# Altium footprint library SoM_Artix.PcbLib: 239 footprints (part 2 of 15)
Each footprint in its own frame and in the unit in brackets; x right, y up, seen from the top. Pads: shape width x height; smd on the part's side, far side on the other; paste and mask are expansions set on the pad; w line width, h text height; cw(c..) or ccw(c..) is an arc to the next point about the centre after c.
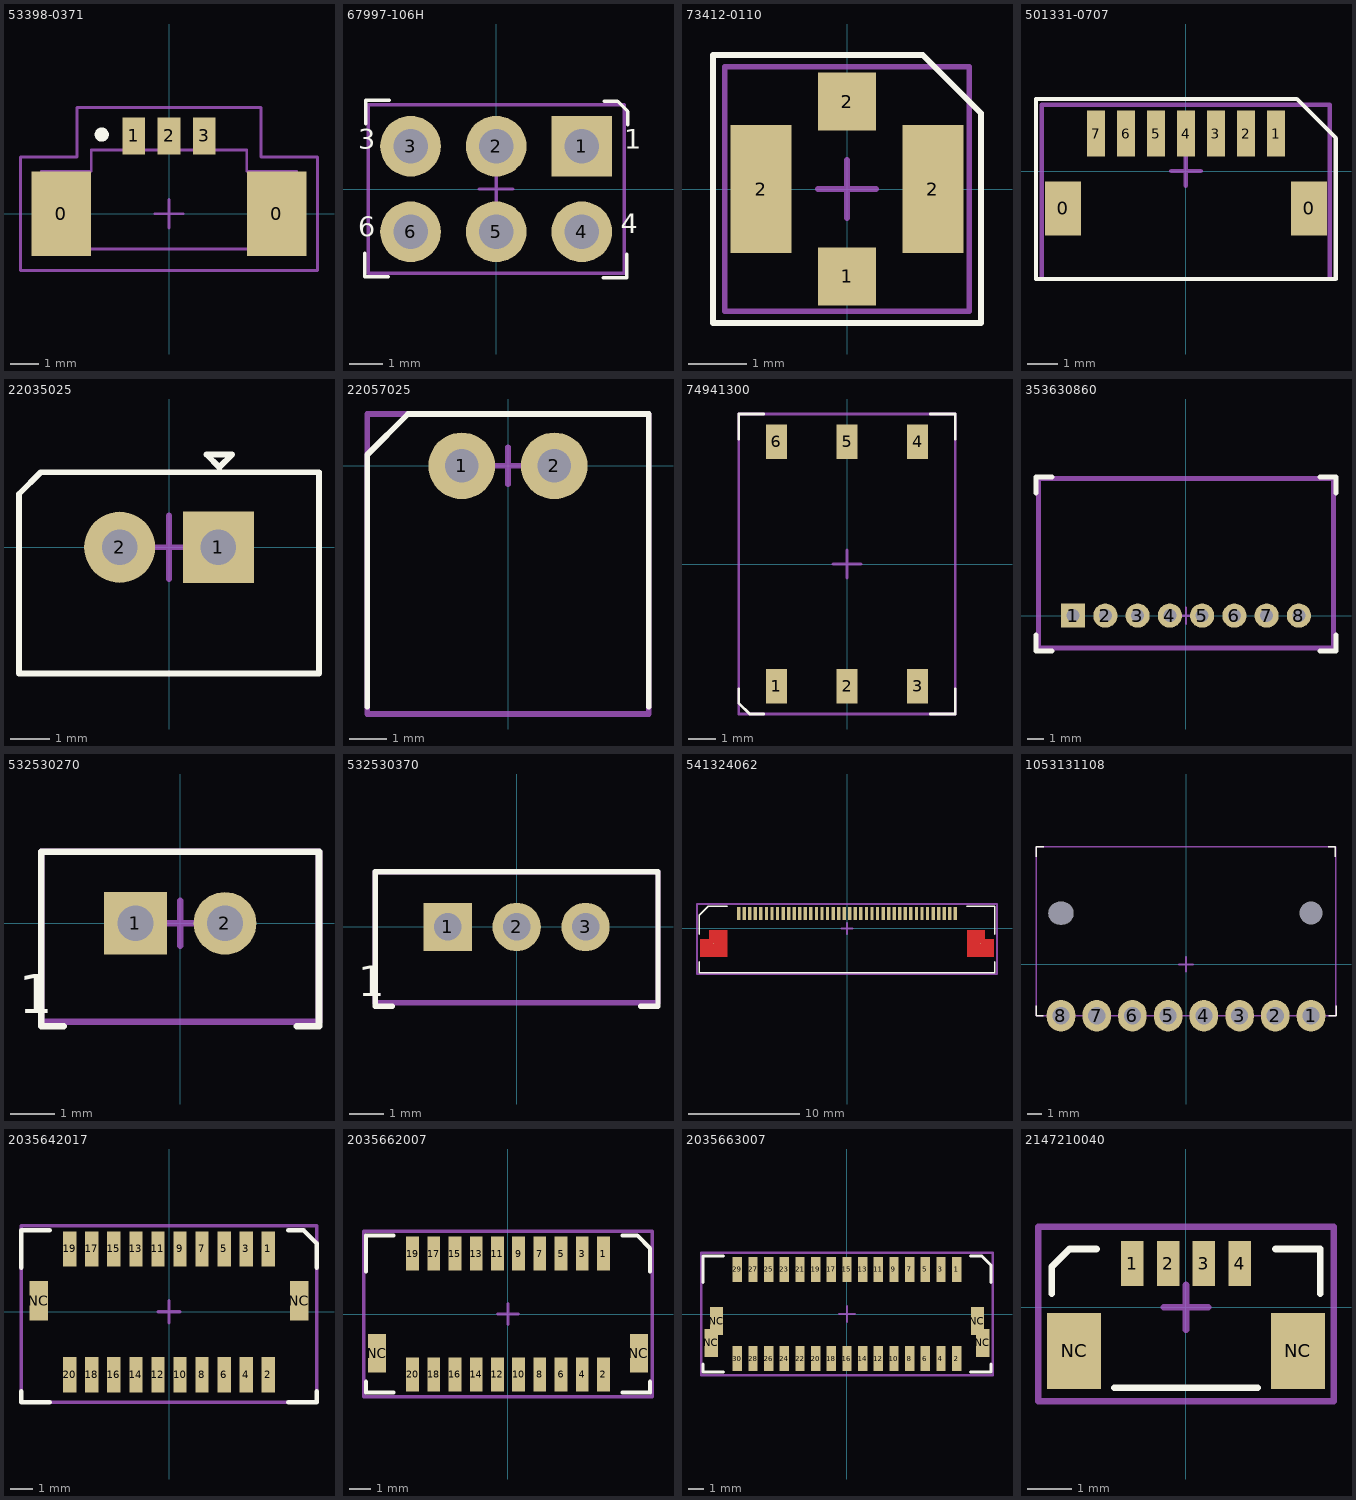
[diagram p1: the footprints below, top view; thin cyan lines are the x and y axes]

## 53398-0371 [mm] "PicoBlade™ 53398-0371"
height 4.7
pads (5):
  rect 2.1x3 smd: 0(-3.8,0) 0(3.8,0)
  rect 0.8x1.3 smd: 1(-1.25,2.75) 2(0,2.75) 3(1.25,2.75)
Top Overlay:
  circle w0.25: c-2.375,2.798 r0.125
Mechanical 1:
  lines w0.1: -4.5,-1.25 4.5,-1.25 4.5,1.5 2.75,1.5 2.75,2.25 -2.75,2.25 -2.75,1.5 -4.5,1.5 -4.5,-1.25
Mechanical 13:
  lines w0.1: -3.5,-0.75 -3.5,1 -4,0.5 ; -1.5,2.25 -1.5,3.25 -1,3.25 -1,2.25 ; -0.5,0 0.5,0 ; -0.25,2.25 -0.25,3.25 0.25,3.25 0.25,2.25 ; 0,-0.5 0,0.5 ; 1,2.25 1,3.25 1.5,3.25 1.5,2.25 ; -4,0.5 -4,0.5 ; -5.25,-2 5.25,-2 5.25,2 3.25,2 3.25,3.75 -3,3.75 -3.25,3.75 -3.25,2 -5.25,2 -5.25,-2 ; -4.5,-1.25 4.5,-1.25 4.5,1.5 2.75,1.5 2.75,2.25 -2.75,2.25 -2.75,1.5 -4.5,1.5 -4.5,-1.25
3D body "533980371.stp": height 4.7, standoff 0, extent -4.45,-1.35 4.45,2.85

## 67997-106H [mm]
pads (6):
  rect 1.8x1.8 hole 1.02 unplated mask+0.05: 1(2.54,1.27)
  round 1.8 hole 1.02 unplated mask+0.05: 2(0,1.27) 3(-2.54,1.27) 4(2.54,-1.27) 5(0,-1.27) 6(-2.54,-1.27)
Top Overlay:
  lines w0.1: -3.9,-1.9 -3.9,-2.6 -3.2,-2.6 ; -3.87,1.93 -3.87,2.63 -3.17,2.63 ; 3.17,-2.63 3.87,-2.63 3.87,-1.93 ; 3.2,2.6 3.6,2.6 3.9,2.3 3.9,1.9
  text "4" at 3.701,-1.5 h1
  text "6" at -4.1,-1.6 h1
  text "3" at -4.1,1 h1
  text "1" at 3.8,1 h1
Mechanical 15:
  lines w0.1: -0.5,0 0.5,0 ; 0,-0.5 0,0.5 ; -3.8,-2.5 -3.8,2.5 3.8,2.5 3.8,-2.5 -3.8,-2.5
3D body "User Library-PLD-6-2.STEP": height 7.83, standoff -2.97, extent -3.813,-2.517 3.807,2.483

## 73412-0110 [mm] "Connector pigtail"
pads (4):
  rect 1x1 smd: 1(0,-1.5) 2(0,1.5)
  rect 1.05x2.2 smd: 2(-1.475,0) 2(1.475,0)
Top Overlay:
  lines w0.1: -2.3,-2.3 -2.3,2.3 1.3,2.3 2.3,1.3 2.3,-2.3 -2.3,-2.3
Mechanical 13:
  lines w0.1: -0.5,0 0.5,0 ; 0,-0.5 0,0.5 ; -2.1,-2.1 2.1,-2.1 2.1,2.1 -2.1,2.1 -2.1,-2.1
3D body "734120110.stp": height 1.25, standoff 0, extent -1.5,-1.54 1.5,1.54

## 501331-0707 [mm] "Headers & Wire Housings 1.0 WtB 7Ckt StrWaferAssyEmbsTpPk"
height 5
pads (9):
  rect 1.2x1.8 smd: 0(-4.1,-1.25) 0(4.1,-1.25)
  rect 0.6x1.55 smd: 1(3,1.25) 2(2,1.25) 3(1,1.25) 4(0,1.25) 5(-1,1.25) 6(-2,1.25) 7(-3,1.25)
Top Overlay:
  lines w0.15: -5,-3.6 5,-3.6 5,1.1 3.7,2.4 -5,2.4 -5,-3.6
Mechanical 13:
  lines w0.15: -0.5,0 0.5,0 ; 0,-0.5 0,0.5 ; -4.8,-3.6 -4.8,2.2 4.8,2.2 4.8,-3.6 -4.8,-3.6
3D body "5013310707.stp": height 5.55, standoff 0, extent -4.62,-3.64 4.62,1.71

## 22035025 [mm] "2.50mm Pitch, Mini-SPOX PCB Header"
height 5.9
pads (2):
  rect 1.8x1.8 hole 0.9 mask+0.05: 1(1.25,0)
  round 1.8 hole 0.9 mask+0.05: 2(-1.25,0)
Top Overlay:
  lines w0.15: -3.8,-3.2 3.8,-3.2 3.8,1.9 -3.25,1.9 -3.8,1.35 -3.8,-3.2 ; 0.95,2.35 1.275,2.025 1.6,2.35 0.95,2.35
Mechanical 3:
  lines w0.15: -1.25,0 1.25,0 ; 0,-0.8 0,0.8
3D body "022035025.stp": height 5.95, standoff -3.45, extent -3.7,-3.12 3.7,1.78

## 22057025 [mm]
height 4.9
pads (2):
  round 1.8 hole 0.9: 1(-1.25,0) 2(1.25,0)
Top Overlay:
  lines w0.15: -3.8,-6.5 -3.8,0.3 -2.7,1.4 3.8,1.4 3.8,-6.5
Mechanical 15:
  lines w0.15: -0.5,0 0.5,0 ; 0,-0.5 0,0.5 ; -3.8,-6.7 -3.8,1.4 3.8,1.4 3.8,-6.7 -3.8,-6.7
3D body "022057025.stp": height 4.8, standoff -3.6, extent -3.7,-6.6 3.7,1.3

## 74941300 [mm]
pads (6):
  rect 0.76x1.25 smd mask+0.05: 1(-2.54,-4.4) 2(0,-4.4) 3(2.54,-4.4) 4(2.54,4.4) 5(0,4.4) 6(-2.54,4.4)
Top Overlay:
  lines w0.1: -3.9,-4.5 -3.9,-5 -3.5,-5.4 -3,-5.4 ; -3.9,4.5 -3.9,5.4 -3,5.4 ; 3,-5.4 3.9,-5.4 3.9,-4.5 ; 3,5.4 3.9,5.4 3.9,4.5
Mechanical 15:
  lines w0.1: -0.5,0 0.5,0 ; 0,-0.5 0,0.5 ; -3.9,-5.4 3.9,-5.4 3.9,5.4 -3.9,5.4 -3.9,-5.4
3D body "STP_WE-BMS_74941300 (rev1).stp": height 5.41, standoff 0, extent -3.8,-4.725 3.8,4.725

## 353630860 [mm]
pads (8):
  rect 1.5x1.5 hole 0.8: 1(-7,0)
  round 1.5 hole 0.8: 2(-5,0) 3(-3,0) 4(-1,0) 5(1,0) 6(3,0) 7(5,0) 8(7,0)
Top Overlay:
  lines w0.3: -9.3,-1.2 -9.3,-2.2 -8.3,-2.2 ; -9.3,7.6 -9.3,8.6 -8.3,8.6 ; 8.3,-2.2 9.3,-2.2 9.3,-1.2 ; 8.3,8.6 9.3,8.6 9.3,7.6
Mechanical 13:
  lines w0.15: -0.5,0 0.5,0 ; 0,-0.5 0,0.5
  lines w0.3: -9.15,-2 9.15,-2 9.15,8.5 -9.15,8.5 -9.15,-2
3D body "353630860.stp": height 5.55, standoff -3.15, extent -9.15,-1.95 9.15,8.55

## 532530270 [mm]
pads (2):
  rect 1.4x1.4 hole 0.8 mask+0.07: 1(-1,0)
  round 1.4 hole 0.8 mask+0.07: 2(1,0)
Top Overlay:
  lines w0.15: -2.6,-2.3 -3.1,-2.3 -3.1,1.6 3.1,1.6 3.1,-2.3 2.6,-2.3
  text "1" at -3.6,-2.3 h1.5
Mechanical 15:
  lines w0.15: -0.5,0 0.5,0 ; 0,-0.5 0,0.5 ; -3.1,-2.2 -3.1,1.6 3.1,1.6 3.1,-2.2 -3.1,-2.2
3D body "532530270.stp": height 5.7, standoff -3.3, extent -3,-2.15 3,1.5

## 532530370 [mm]
pads (3):
  rect 1.4x1.4 hole 0.8 mask+0.07: 1(-2,0)
  round 1.4 hole 0.8 mask+0.07: 2(0,0) 3(2,0)
Top Overlay:
  lines w0.15: -3.6,-2.3 -4.1,-2.3 -4.1,1.6 4.1,1.6 4.1,-2.3 3.6,-2.3
  text "1" at -4.6,-2.3 h1.5
Mechanical 15:
  lines w0.15: -0.5,0 0.5,0 ; 0,-0.5 0,0.5 ; -4.1,-2.2 -4.1,1.6 4.1,1.6 4.1,-2.2 -4.1,-2.2
3D body "532530370.stp": height 5.7, standoff -3.3, extent -4,-2.2 4,1.45

## 541324062 [mm]
pads (42):
  round 0.025 smd paste-0.001: 0(-12,-1.35) 0(12,-1.35)
  rect 0.3x1.2 smd mask+0.05: 1(-9.75,1.35) 2(-9.25,1.35) 3(-8.75,1.35) 4(-8.25,1.35) 5(-7.75,1.35) 6(-7.25,1.35) 7(-6.75,1.35) 8(-6.25,1.35) 9(-5.75,1.35) 10(-5.25,1.35) 11(-4.75,1.35) 12(-4.25,1.35) 13(-3.75,1.35) 14(-3.25,1.35) 15(-2.75,1.35) 16(-2.25,1.35) 17(-1.75,1.35) 18(-1.25,1.35) 19(-0.75,1.35) 20(-0.25,1.35) 21(0.25,1.35) 22(0.75,1.35) 23(1.25,1.35) 24(1.75,1.35) 25(2.25,1.35) 26(2.75,1.35) 27(3.25,1.35) 28(3.75,1.35) 29(4.25,1.35) 30(4.75,1.35) 31(5.25,1.35) 32(5.75,1.35) 33(6.25,1.35) 34(6.75,1.35) 35(7.25,1.35) 36(7.75,1.35) 37(8.25,1.35) 38(8.75,1.35) 39(9.25,1.35) 40(9.75,1.35)
Top Layer:
  region: 13.2,-2.55 13.2,-0.95 12.4,-0.95 12.4,-0.15 10.8,-0.15 10.8,-2.55
  region: -13.2,-2.55 -13.2,-0.95 -12.4,-0.95 -12.4,-0.15 -10.8,-0.15 -10.8,-2.55
Top Overlay:
  lines w0.15: -13.3,-3 -13.3,-4 13.3,-4 13.3,-3 ; -13.3,-0.5 -13.3,1.2 -12.5,2 -10.8,2 ; 10.8,2 13.3,2 13.3,-0.5
Mechanical 15:
  lines w0.15: -0.5,0 0.5,0 ; 0,-0.5 0,0.5 ; -13.5,-4.1 13.5,-4.1 13.5,2.2 -13.5,2.2 -13.5,-4.1
3D body "541324062.stp": height 2.05, standoff 0, extent -12.75,-4 12.75,1.6

## 1053131108 [mm]
pads (10):
  oval 2x2.2 hole 1.2 mask+0.05: 1(8.75,-3.59) 2(6.25,-3.59) 3(3.75,-3.59) 4(1.25,-3.59) 5(-1.25,-3.59) 6(-3.75,-3.59) 7(-6.25,-3.59) 8(-8.75,-3.59)
  round 0 hole 1.6 slot 1.75 at 0 deg unplated mask+0.05: NC(-8.75,3.59)
  round 0 hole 1.6 unplated mask+0.05: NC1(8.75,3.59)
Top Overlay:
  lines w0.1: -10.5,-2.9 -10.5,-3.6 -10,-3.6 ; -10.469,7.544 -10.469,8.244 -9.969,8.244 ; 9.965,8.248 10.465,8.248 10.465,7.548 ; 10,-3.6 10.5,-3.6 10.5,-2.9
Mechanical 15:
  lines w0.1: -10.47,-3.59 -10.47,8.25 10.47,8.25 10.47,-3.59 -10.47,-3.59
  lines w0.15: -0.5,0 0.5,0 ; 0,-0.5 0,0.5

## 2035642017 [mm] "1.00mm Pitch, Pico-Clasp PCB Header, Dual Row, Right-Angle, Surface Mount, 0.38µm Gold Plated, Inner Positive Lock, 20 Circuits, Natural"
pads (22):
  rect 0.6x1.6 smd: 1(4.5,2.85) 2(4.5,-2.85) 3(3.5,2.85) 4(3.5,-2.85) 5(2.5,2.85) 6(2.5,-2.85) 7(1.5,2.85) 8(1.5,-2.85) 9(0.5,2.85) 10(0.5,-2.85) 11(-0.5,2.85) 12(-0.5,-2.85) 13(-1.5,2.85) 14(-1.5,-2.85) 15(-2.5,2.85) 16(-2.5,-2.85) 17(-3.5,2.85) 18(-3.5,-2.85) 19(-4.5,2.85) 20(-4.5,-2.85)
  rect 0.85x1.8 smd: NC(-5.9,0.5) NC(5.9,0.5)
Top Overlay:
  lines w0.2: -6.7,-3.6 -6.7,-4.1 -5.4,-4.1 ; -6.7,2 -6.7,3.7 -5.4,3.7 ; 5.4,-4.1 6.7,-4.1 6.7,-3.6 ; 5.4,3.7 6.1,3.7 6.7,3.1 6.7,2
Mechanical 15:
  lines w0.15: -0.5,0 0.5,0 ; 0,-0.5 0,0.5 ; -6.7,-4.1 6.7,-4.1 6.7,3.9 -6.7,3.9 -6.7,-4.1
3D body "2035642017.stp": height 5.57, standoff 0, extent -6.15,-4.02 6.15,3.25

## 2035662007 [mm] "1.00mm Pitch, Pico-Clasp PCB Header, Dual Row, Right-Angle, Surface Mount, 0.38µm Gold Plated, Inner Positive Lock, 20 Circuits, Natural"
pads (22):
  rect 0.6x1.6 smd: 1(4.5,2.85) 2(4.5,-2.85) 3(3.5,2.85) 4(3.5,-2.85) 5(2.5,2.85) 6(2.5,-2.85) 7(1.5,2.85) 8(1.5,-2.85) 9(0.5,2.85) 10(0.5,-2.85) 11(-0.5,2.85) 12(-0.5,-2.85) 13(-1.5,2.85) 14(-1.5,-2.85) 15(-2.5,2.85) 16(-2.5,-2.85) 17(-3.5,2.85) 18(-3.5,-2.85) 19(-4.5,2.85) 20(-4.5,-2.85)
  rect 0.85x1.8 smd: NC(-6.175,-1.85) NC(6.175,-1.85)
Top Overlay:
  lines w0.2: -6.7,-3.2 -6.7,-3.7 -5.4,-3.7 ; -6.7,2 -6.7,3.7 -5.4,3.7 ; 5.4,-3.7 6.7,-3.7 6.7,-3.2 ; 5.4,3.7 6.1,3.7 6.7,3.1 6.7,2
Mechanical 15:
  lines w0.15: -0.5,0 0.5,0 ; 0,-0.5 0,0.5 ; -6.8,-3.9 6.8,-3.9 6.8,3.9 -6.8,3.9 -6.8,-3.9
3D body "2035662007.stp": height 8.25, standoff 0, extent -6.5,-3.3 6.5,3.2

## 2035663007 [mm]
pads (34):
  rect 0.6x1.6 smd: 1(7,2.85) 2(7,-2.85) 3(6,2.85) 4(6,-2.85) 5(5,2.85) 6(5,-2.85) 7(4,2.85) 8(4,-2.85) 9(3,2.85) 10(3,-2.85) 11(2,2.85) 12(2,-2.85) 13(1,2.85) 14(1,-2.85) 15(0,2.85) 16(0,-2.85) 17(-1,2.85) 18(-1,-2.85) 19(-2,2.85) 20(-2,-2.85) 21(-3,2.85) 22(-3,-2.85) 23(-4,2.85) 24(-4,-2.85) 25(-5,2.85) 26(-5,-2.85) 27(-6,2.85) 28(-6,-2.85) 29(-7,2.85) 30(-7,-2.85)
  rect 0.85x1.8 smd: NC(-8.675,-1.85) NC(-8.325,-0.45) NC(8.325,-0.45) NC(8.675,-1.85)
Top Overlay:
  lines w0.2: -9.2,-3.2 -9.2,-3.7 -7.9,-3.7 ; -9.2,2 -9.2,3.7 -7.9,3.7 ; 7.9,-3.7 9.2,-3.7 9.2,-3.2 ; 7.9,3.7 8.6,3.7 9.2,3.1 9.2,2
Mechanical 15:
  lines w0.15: -0.5,0 0.5,0 ; 0,-0.5 0,0.5 ; -9.3,-3.9 -9.3,3.9 9.3,3.9 9.3,-3.9 -9.3,-3.9
3D body "2035663007.stp": height 8.23, standoff -0.03, extent -9,-3 9,3.5

## 2147210040 [mm]
height 1.6
pads (6):
  rect 0.5x1 smd: 1(-1.2,0.975) 2(-0.4,0.975) 3(0.4,0.975) 4(1.2,0.975)
  rect 1.2x1.7 smd: NC(-2.5,-0.975) NC(2.5,-0.975)
Top Overlay:
  lines w0.15: -3,0.3 -3,0.9 -2.6,1.3 -2,1.3 ; -1.6,-1.8 1.6,-1.8 ; 2,1.3 3,1.3 3,0.3
Mechanical 13:
  lines w0.15: -0.5,0 0.5,0 ; 0,-0.5 0,0.5 ; -3.3,-2.1 3.3,-2.1 3.3,1.8 -3.3,1.8 -3.3,-2.1
3D body "2147210040.stp": height 1.6, standoff 0, extent -2.74,-1.5 2.74,1